# Altium footprint library AD_Comments.PcbLib: 178 footprints (part 1 of 12)
Each footprint in its own frame and in the unit in brackets; x right, y up, seen from the top. Pads: shape width x height; smd on the part's side, far side on the other; paste and mask are expansions set on the pad; w line width, h text height; cw(c..) or ccw(c..) is an arc to the next point about the centre after c.
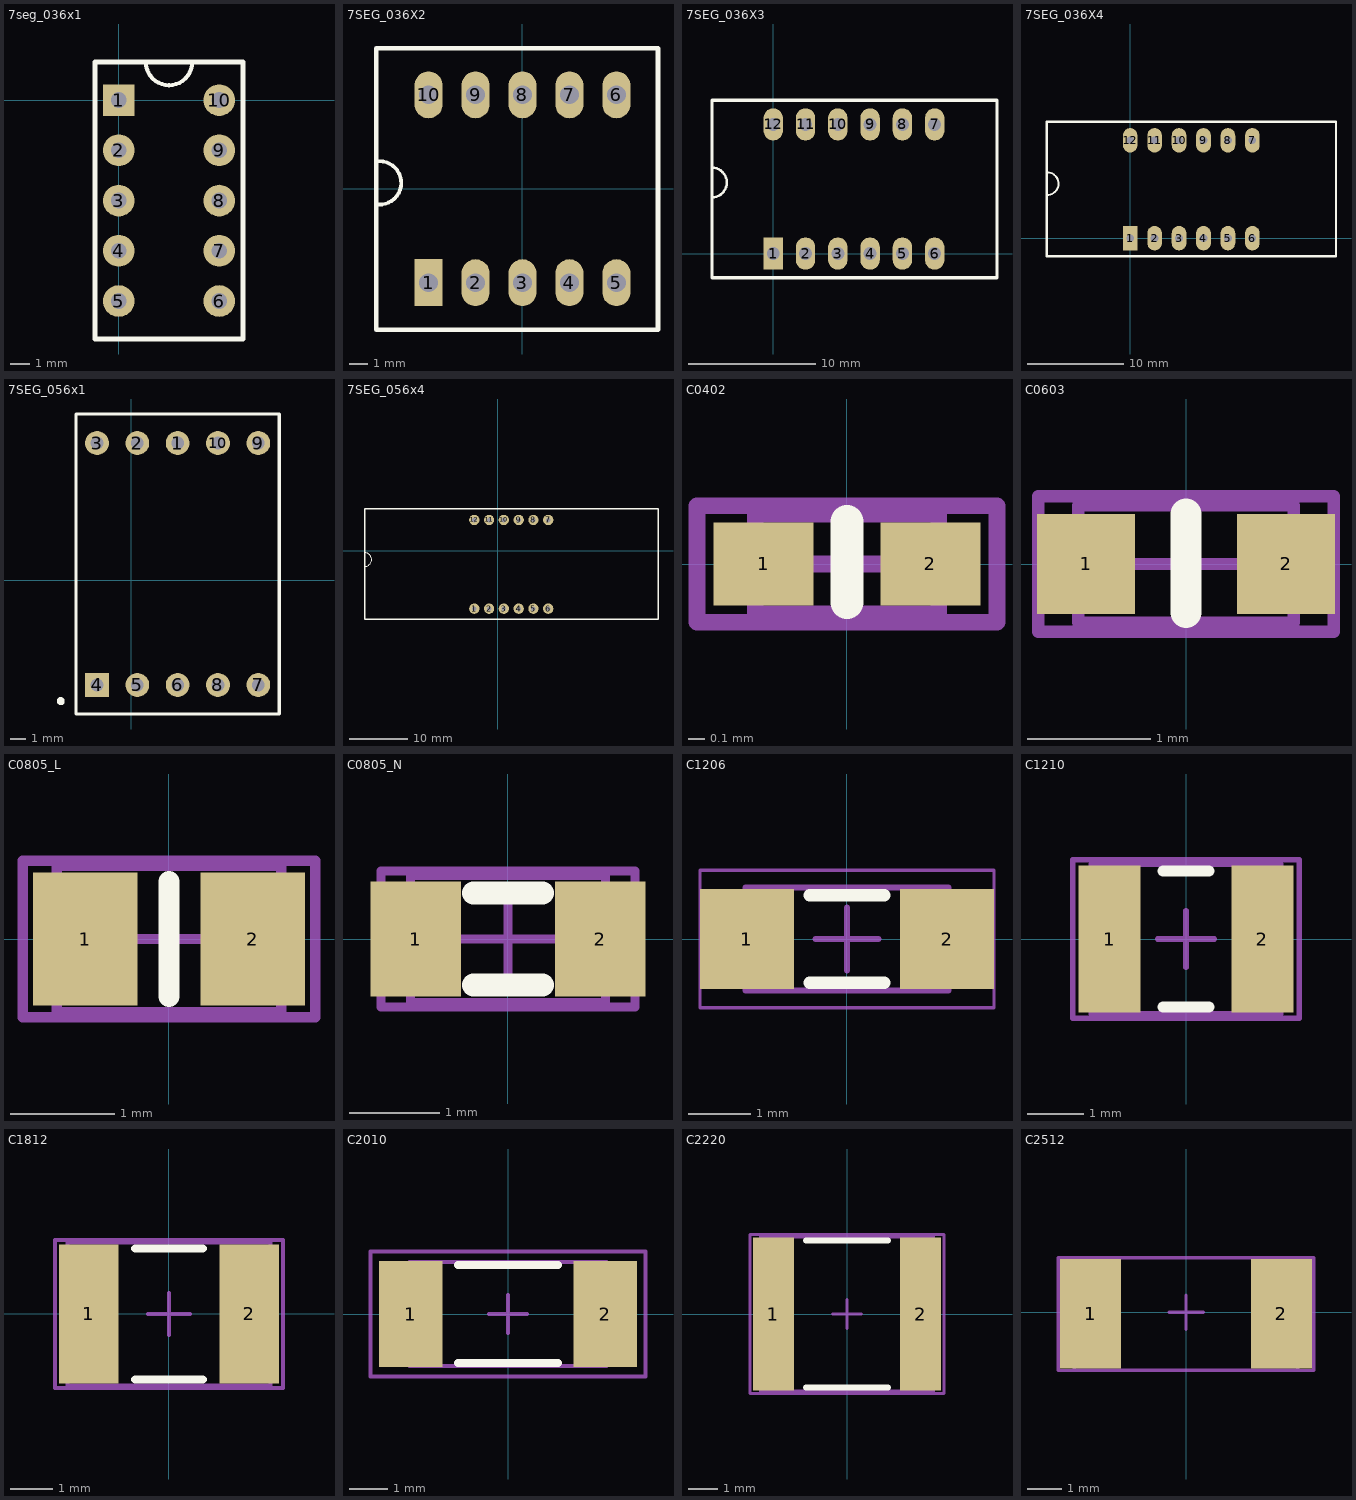
[diagram p0: the footprints below, top view; thin cyan lines are the x and y axes]

## 7seg_036x1 [mm]
pads (10):
  rect 1.6x1.6 hole 0.8: 1(0,0)
  round 1.6 hole 0.8: 2(0,-2.54) 3(0,-5.08) 4(0,-7.62) 5(0,-10.16) 6(5.08,-10.16) 7(5.08,-7.62) 8(5.08,-5.08) 9(5.08,-2.54) 10(5.08,0)
Top Overlay:
  lines w0.203: 1.371,1.928 ccw(c2.54,1.92) 3.71,1.92
  lines w0.254: -1.21,-12.08 6.29,-12.08 6.29,1.92 -1.21,1.92 -1.21,-12.08
3D body "036_1.step": height 8.5, standoff -4, extent -1.21,-12.08 6.29,1.92

## 7SEG_036X2 [mil]
pads (10):
  rect 60x100 hole 40: 1(-200,-200)
  oval 60x100 hole 40: 2(-100,-200) 3(0,-200) 4(100,-200) 5(200,-200) 6(200,200) 7(100,200) 8(0,200) 9(-100,200) 10(-200,200)
Top Overlay:
  lines w8: -306.5,-33.5 ccw(c-304.2,12.49) -304.2,58.53
  lines w10: -311.5,-300.5 -311.5,299.5 288.5,299.5 288.5,-300.5 -311.5,-300.5

## 7SEG_036X3 [mil]
pads (12):
  rect 60x100 hole 40: 1(0,0)
  oval 60x100 hole 40: 2(100,0) 3(200,0) 4(300,0) 5(400,0) 6(500,0) 7(500,400) 8(400,400) 9(300,400) 10(200,400) 11(100,400) 12(0,400)
Top Overlay:
  lines w8: -190.3,173.96 ccw(c-190,220) -190,266.04
  lines w10: -190,-75 693,-75 693,475 -190,475 -190,-75
3D body "036_3.step": height 279.53, standoff -216.54, extent -189.94,-76.58 691.95,474.6

## 7SEG_036X4 [mm]
pads (12):
  rect 1.524x2.54 hole 0.8: 1(0,0)
  oval 1.524x2.54 hole 0.8: 2(2.54,0) 3(5.08,0) 4(7.62,0) 5(10.16,0) 6(12.7,0) 7(12.7,10.16) 8(10.16,10.16) 9(7.62,10.16) 10(5.08,10.16) 11(2.54,10.16) 12(0,10.16)
Top Overlay:
  lines w0.203: -8.669,4.496 ccw(c-8.611,5.664) -8.611,6.834
  lines w0.254: -8.661,-1.869 -8.661,12.09 21.387,12.09 21.387,-1.869 -8.661,-1.869
3D body "036_4.step": height 7.1, standoff -5.5, extent -8.625,-1.869 21.375,12.131

## 7SEG_056x1 [mm]
pads (10):
  round 1.5 hole 0.8: 1(2.921,8.636) 2(0.381,8.636) 3(-2.159,8.636) 5(0.381,-6.604) 6(2.921,-6.604) 7(8.001,-6.604) 8(5.461,-6.604) 9(8.001,8.636) 10(5.461,8.636)
  rect 1.5x1.5 hole 0.8: 4(-2.159,-6.604)
Top Overlay:
  circle w0.25: c-4.445,-7.62 r0.125
  lines w0.2: -3.479,-8.434 9.321,-8.434 9.321,10.466 -3.479,10.466 -3.479,-8.434
3D body "056_1.step": height 8, standoff -6.3, extent -3.379,-8.509 9.221,10.491

## 7SEG_056x4 [mil]
pads (12):
  round 70 hole 31: 1(-159.84,-392.91) 2(-59.84,-392.91) 3(40.16,-392.91) 4(140.16,-392.91) 5(240.16,-392.91) 6(340.16,-392.91) 7(340.16,207.09) 8(240.16,207.09) 9(140.16,207.09) 10(40.16,207.09) 11(-59.84,207.09) 12(-159.84,207.09)
Top Overlay:
  lines w8: -902.3,-105.99 ccw(c-900,-60) -900,-13.96
  lines w10: -901.96,-464.56 -901.96,283.47 1082.29,283.47 1082.29,-464.56 -901.96,-464.56
3D body "056_4.step": height 314.96, standoff -244.09, extent -901.96,-464.56 1082.29,283.47

## C0402 [mm] "Chip Capacitor, Body 1.0x0.5mm, IPC High Density"
height 1.3
pads (2):
  rect 0.6x0.5 smd: 1(-0.5,0) 2(0.5,0)
Top Overlay:
  lines w0.2: 0,-0.229 0,0.254
Mechanical 13:
  lines w0.1: -0.55,-0.3 -0.55,0.3 0.55,0.3 0.55,-0.3 -0.55,-0.3
Mechanical 15:
  lines w0.1: -0.3,0 0.3,0 ; 0,-0.3 0,0.3 ; -0.9,-0.35 -0.9,0.35 0.9,0.35 0.9,-0.35 -0.9,-0.35
3D body "CAPC1005X56N EIA 0402.step": height 0.56, standoff 0, extent -0.5,-0.25 0.5,0.25

## C0603 [mil] "Chip Capacitor, Body 1.6x0.8mm, IPC High Density"
height 36
pads (2):
  rect 31.5x32 smd: 1(-32,0) 2(32,0)
Top Overlay:
  lines w10: 0,-15.5 0,16
Mechanical 13:
  lines w3.94: -34.45,-18.7 -34.45,18.7 34.45,18.7 34.45,-18.7 -34.45,-18.7
Mechanical 15:
  lines w3.94: -18.7,0 18.7,0 ; 0,-18.7 0,18.7 ; -47.24,-21.65 -47.24,21.65 47.24,21.65 47.24,-21.65 -47.24,-21.65
3D body "User Library-Chip Capacitor0603.step": height 33.86, standoff 0, extent -31.49,-15.74 31.5,15.75

## C0805_L [mm] "Chip Capacitor, Body 2.0x1.2mm, IPC High Density"
height 0.7
pads (2):
  rect 1x1.27 smd: 1(-0.8,0) 2(0.8,0)
Top Overlay:
  lines w0.2: 0,-0.55 0,0.55
Mechanical 13:
  lines w0.1: -1.075,-0.7 -1.075,0.7 1.075,0.7 1.075,-0.7 -1.075,-0.7
Mechanical 15:
  lines w0.1: -0.5,0 0.5,0 ; 0,-0.5 0,0.5 ; -1.4,-0.75 -1.4,0.75 1.4,0.75 1.4,-0.75 -1.4,-0.75
3D body "CAPC2012X70N EIA 0805.step": height 0.7, standoff 0, extent -1,-0.6 1,0.6

## C0805_N [mm] "Chip Capacitor, Body 2.0x1.2mm, IPC Medium Density"
height 0.7
pads (2):
  rect 1x1.27 smd: 1(-1.016,0) 2(1.016,0)
Top Overlay:
  lines w0.254: -0.381,-0.508 0.381,-0.508 ; -0.381,0.508 0.381,0.508
Mechanical 13:
  lines w0.1: -1.075,-0.7 -1.075,0.7 1.075,0.7 1.075,-0.7 -1.075,-0.7
Mechanical 15:
  lines w0.1: -0.5,0 0.5,0 ; 0,-0.5 0,0.5 ; -1.4,-0.75 -1.4,0.75 1.4,0.75 1.4,-0.75 -1.4,-0.75
3D body "CAPC2012X70N EIA 0805.step": height 0.7, standoff 0, extent -1,-0.6 1,0.6

## C1206 [mm] "Chip Capacitor, 2-Leads, Body 3.20x1.60mm, IPC Medium Density"
height 0.6
pads (2):
  rect 1.5x1.6 smd: 1(-1.6,0) 2(1.6,0)
Top Overlay:
  lines w0.2: -0.6,-0.7 0.6,-0.7 ; -0.6,0.7 0.6,0.7
Mechanical 13:
  lines w0.1: -1.625,-0.825 1.625,-0.825 1.625,0.825 -1.625,0.825 -1.625,-0.825
Mechanical 15:
  lines w0.05: -2.35,-1.1 2.35,-1.1 2.35,1.1 -2.35,1.1 -2.35,-1.1
  lines w0.1: -0.5,0 0.5,0 ; 0,-0.5 0,0.5
3D body "CAPC3216X125N EIA 1206.step": height 1.25, standoff 0, extent -1.6,-0.8 1.6,0.8

## C1210 [mm] "Chip Capacitor, Body 3.2x2.5mm, IPC High Density"
height 0.9
pads (2):
  rect 1.1x2.6 smd: 1(-1.35,0) 2(1.35,0)
Top Overlay:
  lines w0.2: -0.4,-1.2 0.4,-1.2 ; -0.4,1.2 0.4,1.2
Mechanical 13:
  lines w0.1: -1.675,-1.32 -1.675,1.32 1.675,1.32 1.675,-1.32 -1.675,-1.32
Mechanical 15:
  lines w0.1: -0.5,0 0.5,0 ; 0,-0.5 0,0.5 ; -2,-1.4 -2,1.4 2,1.4 2,-1.4 -2,-1.4
3D body "CAPC3225X120N EIA 1210.step": height 1.2, standoff 0, extent -1.6,-1.25 1.6,1.25

## C1812 [mm] "Chip Capacitor, Body 4.5x3.2mm, IPC High Density"
height 1.4
pads (2):
  rect 1.4x3.3 smd: 1(-1.9,0) 2(1.9,0)
Top Overlay:
  lines w0.2: -0.8,-1.55 0.8,-1.55 ; -0.8,1.55 0.8,1.55
Mechanical 13:
  lines w0.1: -2.4,-1.7 2.4,-1.7 2.4,1.7 -2.4,1.7 -2.4,-1.7
Mechanical 15:
  lines w0.1: -0.5,0 0.5,0 ; 0,-0.5 0,0.5 ; -2.7,-1.75 2.7,-1.75 2.7,1.75 -2.7,1.75 -2.7,-1.75
3D body "CAPC4532X200N EIA 1812.step": height 2, standoff 0, extent -2.25,-1.6 2.25,1.6

## C2010 [mm] "Chip Capacitor, Body 5.0x2.5mm, IPC High Density"
height 0.6
pads (2):
  rect 1.65x2.75 smd: 1(-2.525,0) 2(2.525,0)
Top Overlay:
  lines w0.2: -1.3,-1.275 1.3,-1.275 ; -1.3,1.275 1.3,1.275
Mechanical 13:
  lines w0.1: -2.565,-1.35 2.565,-1.35 2.565,1.35 -2.565,1.35 -2.565,-1.35
Mechanical 15:
  lines w0.1: -0.5,0 0.5,0 ; 0,-0.5 0,0.5 ; -3.575,-1.625 3.575,-1.625 3.575,1.625 -3.575,1.625 -3.575,-1.625
3D body "CAPC5025X71N EIA 2010.step": height 0.71, standoff 0, extent -2.5,-1.25 2.5,1.25

## C2220 [mm] "Chip Capacitor, Body 5.7x5.0mm, IPC High Density"
height 1.4
pads (2):
  rect 1.4x5.2 smd: 1(-2.5,0) 2(2.5,0)
Top Overlay:
  lines w0.2: -1.4,-2.5 1.4,-2.5 ; -1.4,2.5 1.4,2.5
Mechanical 13:
  lines w0.1: -2.95,-2.625 2.95,-2.625 2.95,2.625 -2.95,2.625 -2.95,-2.625
Mechanical 15:
  lines w0.1: -0.5,0 0.5,0 ; 0,-0.5 0,0.5 ; -3.3,-2.7 3.3,-2.7 3.3,2.7 -3.3,2.7 -3.3,-2.7
3D body "CAPC5750X230N EIA 2220.step": height 2.3, standoff 0, extent -2.85,-2.5 2.85,2.5

## C2512 [mm] "Chip Capacitor, Body 6.4x3.2mm, IPC High Density"
pads (2):
  rect 1.8x3.2 smd: 1(-2.8,-0.05) 2(2.8,-0.05)
Mechanical 13:
  lines w0.1: -3.275,-1.7 3.275,-1.7 3.275,1.6 -3.275,1.6 -3.275,-1.7
Mechanical 15:
  lines w0.1: -0.5,0 0.5,0 ; 0,-0.5 0,0.5 ; -3.746,-1.714 3.746,-1.714 3.746,1.587 -3.746,1.587 -3.746,-1.714
3D body "CAPC6332X71N EIA 2512.step": height 0.71, standoff 0, extent -3.15,-1.6 3.15,1.6